# Altium footprint library Supernova Connectors.PcbLib: 303 footprints (part 7 of 19)
Each footprint in its own frame and in the unit in brackets; x right, y up, seen from the top. Pads: shape width x height; smd on the part's side, far side on the other; paste and mask are expansions set on the pad; w line width, h text height; cw(c..) or ccw(c..) is an arc to the next point about the centre after c.
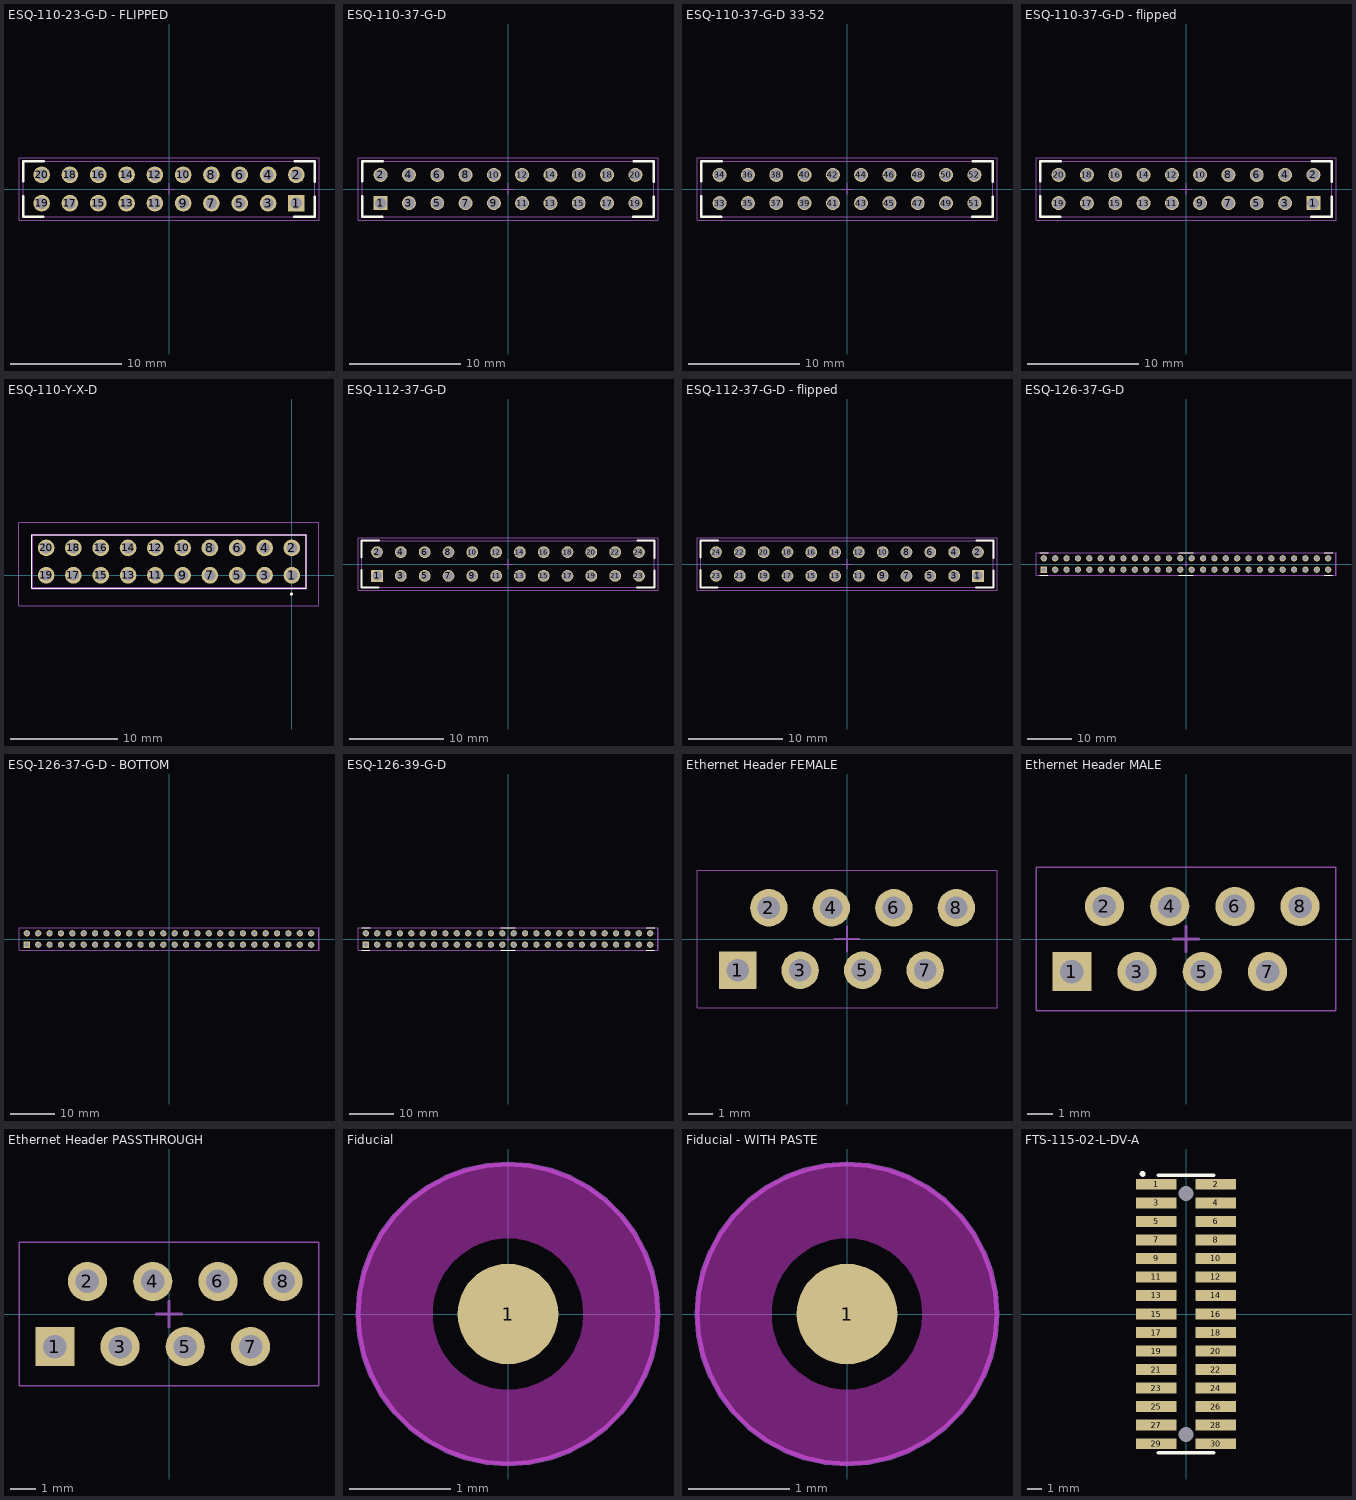
[diagram p6: the footprints below, top view; thin cyan lines are the x and y axes]

## ESQ-110-23-G-D - FLIPPED [mm] "ESQ-126-37-G-D Samtech 52-pin connector"
height 11.05
pads (20):
  rect 1.5x1.5 hole 1.02: 1(11.43,-1.27)
  round 1.5 hole 1.02: 2(11.43,1.27) 3(8.89,-1.27) 4(8.89,1.27) 5(6.35,-1.27) 6(6.35,1.27) 7(3.81,-1.27) 8(3.81,1.27) 9(1.27,-1.27) 10(1.27,1.27) 11(-1.27,-1.27) 12(-1.27,1.27) 13(-3.81,-1.27) 14(-3.81,1.27) 15(-6.35,-1.27) 16(-6.35,1.27) 17(-8.89,-1.27) 18(-8.89,1.27) 19(-11.43,-1.27) 20(-11.43,1.27)
Top Overlay:
  lines w0.2: -13.08,-0.635 -13.08,-2.5 -11.28,-2.5 ; -13.08,0.7 -13.08,2.5 -11.215,2.5 ; 11.215,-2.5 13.08,-2.5 13.08,-0.7 ; 11.28,2.5 13.08,2.5 13.08,0.635
Top 3D Body:
  lines w0.1: -13.081,-2.5 13.08,-2.5 13.08,2.5 -13.081,2.5 ; -13.08,-2.5 -13.08,2.5
Top Courtyard:
  lines w0.05: -13.462,-2.794 13.462,-2.794 13.462,2.794 -13.462,2.794 -13.462,-2.794
  lines w0.1: -0.5,0 0.5,0 ; 0,-0.5 0,0.5
3D body "ESQ-110-23-G-D.stp": height 13.59, standoff -4.83, extent -12.954,-2.54 12.954,2.54

## ESQ-110-37-G-D [mm] "ESQ-126-37-G-D Samtech 52-pin connector"
height 11.05
pads (20):
  rect 1.25x1.25 hole 1.02: 1(-11.43,-1.27)
  round 1.25 hole 1.02: 2(-11.43,1.27) 3(-8.89,-1.27) 4(-8.89,1.27) 5(-6.35,-1.27) 6(-6.35,1.27) 7(-3.81,-1.27) 8(-3.81,1.27) 9(-1.27,-1.27) 10(-1.27,1.27) 11(1.27,-1.27) 12(1.27,1.27) 13(3.81,-1.27) 14(3.81,1.27) 15(6.35,-1.27) 16(6.35,1.27) 17(8.89,-1.27) 18(8.89,1.27) 19(11.43,-1.27) 20(11.43,1.27)
Top Overlay:
  lines w0.2: -13.08,-0.635 -13.08,-2.5 -11.28,-2.5 ; -13.08,0.7 -13.08,2.5 -11.215,2.5 ; 11.215,-2.5 13.08,-2.5 13.08,-0.7 ; 11.28,2.5 13.08,2.5 13.08,0.635
Top 3D Body:
  lines w0.1: -13.081,-2.5 13.08,-2.5 13.08,2.5 -13.081,2.5 ; -13.08,-2.5 -13.08,2.5
Top Courtyard:
  lines w0.05: -13.462,-2.794 13.462,-2.794 13.462,2.794 -13.462,2.794 -13.462,-2.794
  lines w0.1: -0.5,0 0.5,0 ; 0,-0.5 0,0.5
3D body "ESQ-110-37-G-D.stp": height 1.83, standoff -11.51, extent -12.954,-2.54 12.954,2.54

## ESQ-110-37-G-D 33-52 [mm] "ESQ-126-37-G-D Samtech 52-pin connector"
height 11.05
pads (20):
  round 1.25 hole 1.02: 33(-11.43,-1.27) 34(-11.43,1.27) 35(-8.89,-1.27) 36(-8.89,1.27) 37(-6.35,-1.27) 38(-6.35,1.27) 39(-3.81,-1.27) 40(-3.81,1.27) 41(-1.27,-1.27) 42(-1.27,1.27) 43(1.27,-1.27) 44(1.27,1.27) 45(3.81,-1.27) 46(3.81,1.27) 47(6.35,-1.27) 48(6.35,1.27) 49(8.89,-1.27) 50(8.89,1.27) 51(11.43,-1.27) 52(11.43,1.27)
Top Overlay:
  lines w0.2: -13.08,-0.635 -13.08,-2.5 -11.28,-2.5 ; -13.08,0.7 -13.08,2.5 -11.215,2.5 ; 11.215,-2.5 13.08,-2.5 13.08,-0.7 ; 11.28,2.5 13.08,2.5 13.08,0.635
Top 3D Body:
  lines w0.1: -13.081,-2.5 13.08,-2.5 13.08,2.5 -13.081,2.5 ; -13.08,-2.5 -13.08,2.5
Top Courtyard:
  lines w0.05: -13.462,-2.794 13.462,-2.794 13.462,2.794 -13.462,2.794 -13.462,-2.794
  lines w0.1: -0.5,0 0.5,0 ; 0,-0.5 0,0.5
3D body "ESQ-110-37-G-D.stp": height 1.83, standoff -11.51, extent -12.954,-2.54 12.954,2.54

## ESQ-110-37-G-D - flipped [mm] "ESQ-126-37-G-D Samtech 52-pin connector"
height 11.05
pads (20):
  rect 1.25x1.25 hole 1.02: 1(11.43,-1.27)
  round 1.25 hole 1.02: 2(11.43,1.27) 3(8.89,-1.27) 4(8.89,1.27) 5(6.35,-1.27) 6(6.35,1.27) 7(3.81,-1.27) 8(3.81,1.27) 9(1.27,-1.27) 10(1.27,1.27) 11(-1.27,-1.27) 12(-1.27,1.27) 13(-3.81,-1.27) 14(-3.81,1.27) 15(-6.35,-1.27) 16(-6.35,1.27) 17(-8.89,-1.27) 18(-8.89,1.27) 19(-11.43,-1.27) 20(-11.43,1.27)
Top Overlay:
  lines w0.2: -13.08,-0.635 -13.08,-2.5 -11.28,-2.5 ; -13.08,0.7 -13.08,2.5 -11.215,2.5 ; 11.215,-2.5 13.08,-2.5 13.08,-0.7 ; 11.28,2.5 13.08,2.5 13.08,0.635
Top 3D Body:
  lines w0.1: -13.081,-2.5 13.08,-2.5 13.08,2.5 -13.081,2.5 ; -13.08,-2.5 -13.08,2.5
Top Courtyard:
  lines w0.05: -13.462,-2.794 -13.462,2.794 13.462,2.794 13.462,-2.794 -13.462,-2.794
  lines w0.1: -0.5,0 0.5,0 ; 0,-0.5 0,0.5
3D body "ESQ-110-37-G-D.stp": height 11.05, standoff -2.29, extent -12.954,-2.54 12.954,2.54

## ESQ-110-Y-X-D [mm]
pads (20):
  round 1.55 hole 1.02: 1(0,0) 2(0,2.54) 3(-2.54,0) 4(-2.54,2.54) 5(-5.08,0) 6(-5.08,2.54) 7(-7.62,0) 8(-7.62,2.54) 9(-10.16,0) 10(-10.16,2.54) 11(-12.7,0) 12(-12.7,2.54) 13(-15.24,0) 14(-15.24,2.54) 15(-17.78,0) 16(-17.78,2.54) 17(-20.32,0) 18(-20.32,2.54) 19(-22.86,0) 20(-22.86,2.54)
Top Overlay:
  circle w0.2: c-0.05,-1.75 r0.05
  lines w0.1: -24.18,-1.205 -24.18,3.745 1.32,3.745 1.32,-1.205 -24.18,-1.205
Top 3D Body:
  lines w0.2: -24.18,-1.205 -24.18,3.745 1.32,3.745 1.32,-1.205 -24.18,-1.205
Top Courtyard:
  lines w0.05: -25.38,-2.85 -25.38,4.945 2.52,4.945 2.52,-2.85 -25.38,-2.85

## ESQ-112-37-G-D [mm] "ESQ-126-37-G-D Samtech 52-pin connector"
height 11.05
pads (24):
  rect 1.25x1.25 hole 1.02: 1(-13.97,-1.27)
  round 1.25 hole 1.02: 2(-13.97,1.27) 3(-11.43,-1.27) 4(-11.43,1.27) 5(-8.89,-1.27) 6(-8.89,1.27) 7(-6.35,-1.27) 8(-6.35,1.27) 9(-3.81,-1.27) 10(-3.81,1.27) 11(-1.27,-1.27) 12(-1.27,1.27) 13(1.27,-1.27) 14(1.27,1.27) 15(3.81,-1.27) 16(3.81,1.27) 17(6.35,-1.27) 18(6.35,1.27) 19(8.89,-1.27) 20(8.89,1.27) 21(11.43,-1.27) 22(11.43,1.27) 23(13.97,-1.27) 24(13.97,1.27)
Top Overlay:
  lines w0.2: -15.62,-0.635 -15.62,-2.5 -13.82,-2.5 ; -15.62,0.7 -15.62,2.5 -13.755,2.5 ; 13.755,-2.5 15.62,-2.5 15.62,-0.7 ; 13.82,2.5 15.62,2.5 15.62,0.635
Top 3D Body:
  lines w0.1: -15.621,-2.5 15.62,-2.5 15.62,2.5 -15.621,2.5 ; -15.62,-2.5 -15.62,2.5
Top Courtyard:
  lines w0.05: -16.002,-2.794 16.002,-2.794 16.002,2.794 -16.002,2.794 -16.002,-2.794
  lines w0.1: -0.5,0 0.5,0 ; 0,-0.5 0,0.5
3D body "ESQ-112-37-G-D.stp": height 1.83, standoff -11.51, extent -15.494,-2.54 15.494,2.54

## ESQ-112-37-G-D - flipped [mm] "ESQ-126-37-G-D Samtech 52-pin connector"
height 11.05
pads (24):
  rect 1.25x1.25 hole 1.02: 1(13.97,-1.27)
  round 1.25 hole 1.02: 2(13.97,1.27) 3(11.43,-1.27) 4(11.43,1.27) 5(8.89,-1.27) 6(8.89,1.27) 7(6.35,-1.27) 8(6.35,1.27) 9(3.81,-1.27) 10(3.81,1.27) 11(1.27,-1.27) 12(1.27,1.27) 13(-1.27,-1.27) 14(-1.27,1.27) 15(-3.81,-1.27) 16(-3.81,1.27) 17(-6.35,-1.27) 18(-6.35,1.27) 19(-8.89,-1.27) 20(-8.89,1.27) 21(-11.43,-1.27) 22(-11.43,1.27) 23(-13.97,-1.27) 24(-13.97,1.27)
Top Overlay:
  lines w0.2: -15.62,-0.635 -15.62,-2.5 -13.82,-2.5 ; -15.62,0.7 -15.62,2.5 -13.755,2.5 ; 13.755,-2.5 15.62,-2.5 15.62,-0.7 ; 13.82,2.5 15.62,2.5 15.62,0.635
Top 3D Body:
  lines w0.1: -15.621,-2.5 15.62,-2.5 15.62,2.5 -15.621,2.5 ; -15.62,-2.5 -15.62,2.5
Top Courtyard:
  lines w0.05: -16.002,-2.794 -16.002,2.794 16.002,2.794 16.002,-2.794 -16.002,-2.794
  lines w0.1: -0.5,0 0.5,0 ; 0,-0.5 0,0.5
3D body "ESQ-112-37-G-D.stp": height 11.05, standoff -2.29, extent -15.494,-2.54 15.494,2.54

## ESQ-126-37-G-D [mm] "ESQ-126-37-G-D Samtech 52-pin connector"
height 11.05
pads (52):
  rect 1.4x1.4 hole 1.02: 1(-31.75,-1.27)
  round 1.4 hole 1.02: 2(-31.75,1.27) 3(-29.21,-1.27) 4(-29.21,1.27) 5(-26.67,-1.27) 6(-26.67,1.27) 7(-24.13,-1.27) 8(-24.13,1.27) 9(-21.59,-1.27) 10(-21.59,1.27) 11(-19.05,-1.27) 12(-19.05,1.27) 13(-16.51,-1.27) 14(-16.51,1.27) 15(-13.97,-1.27) 16(-13.97,1.27) 17(-11.43,-1.27) 18(-11.43,1.27) 19(-8.89,-1.27) 20(-8.89,1.27) 21(-6.35,-1.27) 22(-6.35,1.27) 23(-3.81,-1.27) 24(-3.81,1.27) 25(-1.27,-1.27) 26(-1.27,1.27) 27(1.27,-1.27) 28(1.27,1.27) 29(3.81,-1.27) 30(3.81,1.27) 31(6.35,-1.27) 32(6.35,1.27) 33(8.89,-1.27) 34(8.89,1.27) 35(11.43,-1.27) 36(11.43,1.27) 37(13.97,-1.27) 38(13.97,1.27) 39(16.51,-1.27) 40(16.51,1.27) 41(19.05,-1.27) 42(19.05,1.27) 43(21.59,-1.27) 44(21.59,1.27) 45(24.13,-1.27) 46(24.13,1.27) 47(26.67,-1.27) 48(26.67,1.27) 49(29.21,-1.27) 50(29.21,1.27) 51(31.75,-1.27) 52(31.75,1.27)
Top Overlay:
  lines w0.2: -32.638,-2.5 -30.838,-2.5 ; -32.638,2.5 -30.773,2.5 ; -1.602,-2.5 1.6,-2.5 ; -1.602,2.5 1.6,2.5 ; 30.862,-2.5 32.662,-2.5 ; 30.862,2.5 32.727,2.5
Top 3D Body:
  lines w0.1: -33.4,-2.5 -33.4,2.5 33.4,2.5 33.4,-2.5 -33.4,-2.5
Top Courtyard:
  lines w0.05: -33.5,-2.5 -33.5,2.5 33.5,2.5 33.5,-2.5 -33.5,-2.5
  lines w0.1: -0.5,0 0.5,0 ; 0,-0.5 0,0.5
3D body "ESQ-126-37-G-D.stp": height 11.05, standoff -2.29, extent -33.274,-2.54 33.274,2.54

## ESQ-126-37-G-D - BOTTOM [mm] "ESQ-126-37-G-D Samtech 52-pin connector"
height 11.05
pads (52):
  rect 1.4x1.4 hole 1.02: 1(-31.75,-1.27)
  round 1.4 hole 1.02: 2(-31.75,1.27) 3(-29.21,-1.27) 4(-29.21,1.27) 5(-26.67,-1.27) 6(-26.67,1.27) 7(-24.13,-1.27) 8(-24.13,1.27) 9(-21.59,-1.27) 10(-21.59,1.27) 11(-19.05,-1.27) 12(-19.05,1.27) 13(-16.51,-1.27) 14(-16.51,1.27) 15(-13.97,-1.27) 16(-13.97,1.27) 17(-11.43,-1.27) 18(-11.43,1.27) 19(-8.89,-1.27) 20(-8.89,1.27) 21(-6.35,-1.27) 22(-6.35,1.27) 23(-3.81,-1.27) 24(-3.81,1.27) 25(-1.27,-1.27) 26(-1.27,1.27) 27(1.27,-1.27) 28(1.27,1.27) 29(3.81,-1.27) 30(3.81,1.27) 31(6.35,-1.27) 32(6.35,1.27) 33(8.89,-1.27) 34(8.89,1.27) 35(11.43,-1.27) 36(11.43,1.27) 37(13.97,-1.27) 38(13.97,1.27) 39(16.51,-1.27) 40(16.51,1.27) 41(19.05,-1.27) 42(19.05,1.27) 43(21.59,-1.27) 44(21.59,1.27) 45(24.13,-1.27) 46(24.13,1.27) 47(26.67,-1.27) 48(26.67,1.27) 49(29.21,-1.27) 50(29.21,1.27) 51(31.75,-1.27) 52(31.75,1.27)
Bottom Overlay:
  lines w0.2: -32.638,-2.5 -30.838,-2.5 ; -32.638,2.5 -30.773,2.5 ; -1.602,-2.5 1.6,-2.5 ; -1.602,2.5 1.6,2.5 ; 30.862,-2.5 32.662,-2.5 ; 30.862,2.5 32.727,2.5
Bottom 3D Body:
  lines w0.1: -33.4,-2.5 33.4,-2.5 33.4,2.5 -33.4,2.5 -33.4,-2.5
Bottom Courtyard:
  lines w0.05: -33.5,-2.5 -33.5,2.5 33.5,2.5 33.5,-2.5 -33.5,-2.5
  lines w0.1: -0.5,0 0.5,0 ; 0,-0.5 0,0.5
3D body "ESQ-126-37-G-D.stp": height 11.05, standoff -2.29, extent -33.274,-2.54 33.274,2.54

## ESQ-126-39-G-D [mm] "ESQ-126-39-G-D Samtech 52-pin connector"
height 11.05
pads (52):
  rect 1.4x1.4 hole 1.02: 1(-31.75,-1.27)
  round 1.4 hole 1.02: 2(-31.75,1.27) 3(-29.21,-1.27) 4(-29.21,1.27) 5(-26.67,-1.27) 6(-26.67,1.27) 7(-24.13,-1.27) 8(-24.13,1.27) 9(-21.59,-1.27) 10(-21.59,1.27) 11(-19.05,-1.27) 12(-19.05,1.27) 13(-16.51,-1.27) 14(-16.51,1.27) 15(-13.97,-1.27) 16(-13.97,1.27) 17(-11.43,-1.27) 18(-11.43,1.27) 19(-8.89,-1.27) 20(-8.89,1.27) 21(-6.35,-1.27) 22(-6.35,1.27) 23(-3.81,-1.27) 24(-3.81,1.27) 25(-1.27,-1.27) 26(-1.27,1.27) 27(1.27,-1.27) 28(1.27,1.27) 29(3.81,-1.27) 30(3.81,1.27) 31(6.35,-1.27) 32(6.35,1.27) 33(8.89,-1.27) 34(8.89,1.27) 35(11.43,-1.27) 36(11.43,1.27) 37(13.97,-1.27) 38(13.97,1.27) 39(16.51,-1.27) 40(16.51,1.27) 41(19.05,-1.27) 42(19.05,1.27) 43(21.59,-1.27) 44(21.59,1.27) 45(24.13,-1.27) 46(24.13,1.27) 47(26.67,-1.27) 48(26.67,1.27) 49(29.21,-1.27) 50(29.21,1.27) 51(31.75,-1.27) 52(31.75,1.27)
Top Overlay:
  lines w0.2: -32.638,-2.5 -30.838,-2.5 ; -32.638,2.5 -30.773,2.5 ; -1.602,-2.5 1.6,-2.5 ; -1.602,2.5 1.6,2.5 ; 30.862,-2.5 32.662,-2.5 ; 30.862,2.5 32.727,2.5
Top 3D Body:
  lines w0.1: -33.4,-2.5 -33.4,2.5 33.4,2.5 33.4,-2.5 -33.4,-2.5
Top Courtyard:
  lines w0.05: -33.5,-2.5 -33.5,2.5 33.5,2.5 33.5,-2.5 -33.5,-2.5
  lines w0.1: -0.5,0 0.5,0 ; 0,-0.5 0,0.5
3D body "ESQ-126-39-G-D.stp": height 11.07, standoff -12.17, extent -33.274,-2.54 33.274,2.54

## Ethernet Header FEMALE [mil]
pads (8):
  rect 60x60 hole 36: 1(-175,-50)
  round 60 hole 36: 2(-125,50) 3(-75,-50) 4(-25,50) 5(25,-50) 6(75,50) 7(125,-50) 8(175,50)
Top Courtyard:
  lines w1.97: -240,-110 -240,110 240,110 240,-110 -240,-110
  lines w3.94: -19.68,0 19.68,0 ; 0,-19.69 0,19.68
3D body "SL-104-T-12_2_14.STEP": height 93.75, standoff -96.25, extent -229.49,-99.99 179.51,0.01
3D body "SL-104-T-12_2_14.STEP": height 93.75, standoff -96.25, extent -179.49,0.01 229.51,100.01

## Ethernet Header MALE [mil]
pads (8):
  rect 60x60 hole 36: 1(-175,-50)
  round 60 hole 36: 2(-125,50) 3(-75,-50) 4(-25,50) 5(25,-50) 6(75,50) 7(125,-50) 8(175,50)
Top Courtyard:
  lines w1.97: -230,-110 230,-110 230,110 -230,110 -230,-110
  lines w3.94: -19.68,0 19.68,0 ; 0,-19.69 0,19.68
3D body "BBL-104-G-F.stp": height 210, standoff -113, extent -174.99,2.01 225.01,98.01
3D body "BBL-104-G-F.stp": height 210, standoff -113, extent -224.99,-97.99 175.01,-1.99

## Ethernet Header PASSTHROUGH [mil]
pads (8):
  rect 60x60 hole 36: 1(-175,-50)
  round 60 hole 36: 2(-125,50) 3(-75,-50) 4(-25,50) 5(25,-50) 6(75,50) 7(125,-50) 8(175,50)
Top Courtyard:
  lines w1.97: -230,-110 230,-110 230,110 -230,110 -230,-110
  lines w3.94: -19.68,0 19.68,0 ; 0,-19.69 0,19.68
3D body "BBS-104-G-A.stp": height 397.99, standoff -62.01, extent -225,-98 175,-2
3D body "BBS-104-G-A.stp": height 397.99, standoff -62.01, extent -175,2 225,98

## Fiducial [mm]
pads (1):
  round 1 smd paste-1 mask+1: 1(0,0)
Top Layer keep-out:
  circle w0.75: c0,0 r1.125
Top Courtyard:
  circle w0.05: c0,0 r1.488

## Fiducial - WITH PASTE [mm]
pads (1):
  round 1 smd mask+1: 1(0,0)
Top Layer keep-out:
  circle w0.75: c0,0 r1.125
Top Courtyard:
  circle w0.05: c0,0 r1.488

## FTS-115-02-L-DV-A [mil]
pads (32):
  rect 110x29 smd: 1(-80,350) 2(80,350) 3(-80,300) 4(80,300) 5(-80,250) 6(80,250) 7(-80,200) 8(80,200) 9(-80,150) 10(80,150) 11(-80,100) 12(80,100) 13(-80,50) 14(80,50) 15(-80,0) 16(80,0) 17(-80,-50) 18(80,-50) 19(-80,-100) 20(80,-100) 21(-80,-150) 22(80,-150) 23(-80,-200) 24(80,-200) 25(-80,-250) 26(80,-250) 27(-80,-300) 28(80,-300) 29(-80,-350) 30(80,-350)
  round 20 hole 40 unplated: ""(0,-325) ""(0,325)
Top Overlay:
  circle w8: c-117.2,378.44 r4
  lines w10: -75,-375 75,-375 ; -75,375 75,375
3D body "FTS-115-02-L-DV-A.stp": height 124, standoff -35, extent -115,-374.99 115,375